# Altium footprint library pcb2D3D库101.PcbLib: 411 footprints (part 4 of 26)
Each footprint in its own frame and in the unit in brackets; x right, y up, seen from the top. Pads: shape width x height; smd on the part's side, far side on the other; paste and mask are expansions set on the pad; w line width, h text height; cw(c..) or ccw(c..) is an arc to the next point about the centre after c.
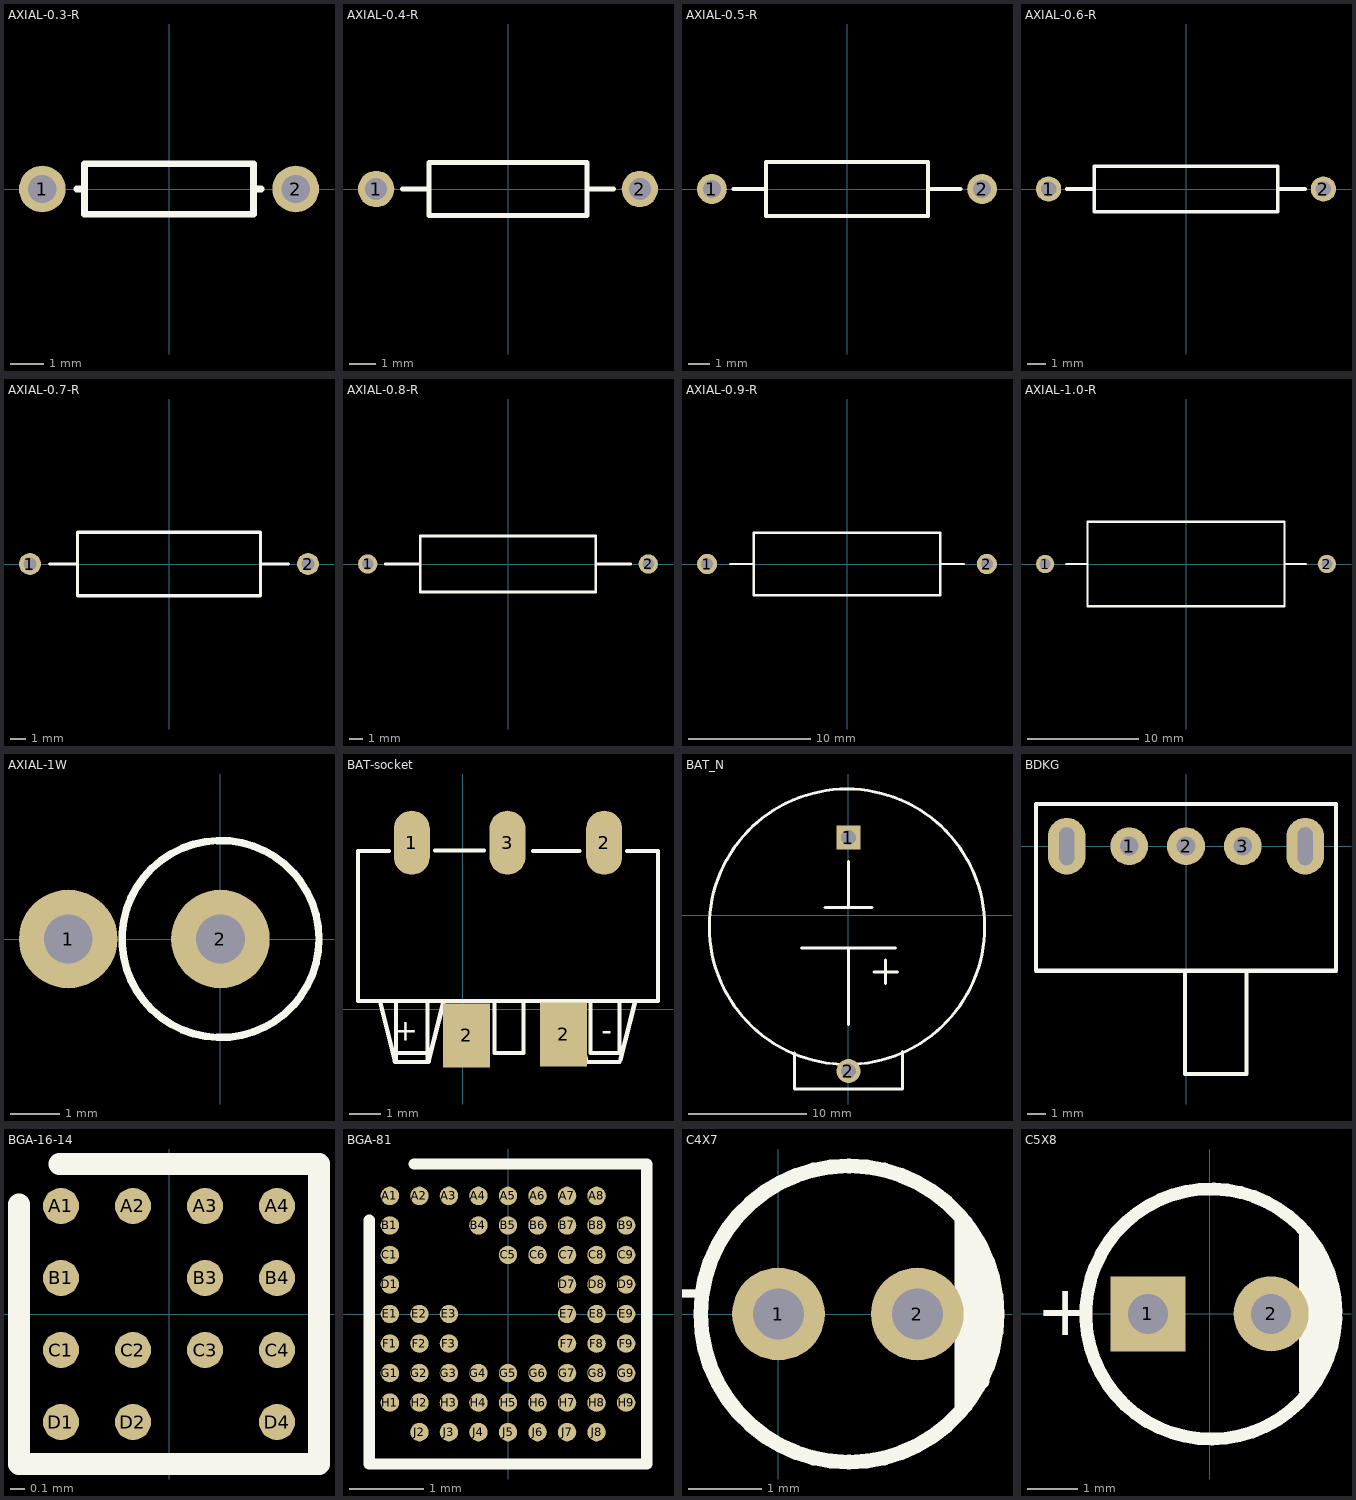
[diagram p3: the footprints below, top view; thin cyan lines are the x and y axes]

## AXIAL-0.3-R [mm] "1/8W"
height 1.524
pads (2):
  round 1.4 hole 0.85: 1(-3.81,0) 2(3.81,0)
TopOverlay:
  lines w0.2: -2.769,0 -2.54,0 ; 2.769,0 2.54,0 ; 2.54,0 2.54,0.762 -2.54,0.762 -2.54,-0.762 2.54,-0.762 2.54,0
3D body "User Library-Resistencia-1.STEP": height 2.36, standoff -1.15, extent -4.064,-0.971 4.064,0.971

## AXIAL-0.4-R [mm] "1/4W/1/2W"
height 2.032
pads (2):
  round 1.4 hole 0.85: 1(-5.08,0) 2(5.08,0)
TopOverlay:
  lines w0.2: -4.064,0 -3.048,0 ; 3.048,0 4.064,0 ; -3.048,-1.016 3.048,-1.016 3.048,1.016 -3.048,1.016 -3.048,-1.016
3D body "AXIAL-0.4-0.25W.STEP": height 3.26, standoff -2, extent -5.38,-1.26 5.38,1.26

## AXIAL-0.5-R [mm] "1/2W/1W"
height 2.54
pads (2):
  round 1.4 hole 0.85: 1(-6.35,0) 2(6.35,0)
TopOverlay:
  lines w0.2: -5.334,0 -3.81,0 ; 3.81,0 5.334,0 ; -3.81,-1.27 3.81,-1.27 3.81,1.27 -3.81,1.27 -3.81,-1.27
3D body "User Library-Resistencia 0_5.STEP": height 3.1, standoff -1.5, extent -6.731,-1.461 6.731,1.397

## AXIAL-0.6-R [mm] "1W"
height 2.54
pads (2):
  round 1.4 hole 0.85: 1(-7.62,0) 2(7.62,0)
TopOverlay:
  lines w0.2: -6.604,0 -5.08,0 ; 5.08,0 6.604,0 ; -5.08,-1.27 5.08,-1.27 5.08,1.27 -5.08,1.27 -5.08,-1.27
3D body "User Library-res_10x15.STEP": height 5.25, standoff -1.5, extent -7.85,-2.25 7.85,2.25

## AXIAL-0.7-R [mm] "Axial Device, Thru-Hole; 2 Leads; 0.7 in Pin Spacing"
height 4.064
pads (2):
  round 1.4 hole 0.85: 1(-8.89,0) 2(8.89,0)
TopOverlay:
  lines w0.2: -7.62,0 -5.842,0 ; 5.842,0 7.62,0 ; -5.842,-2.032 5.842,-2.032 5.842,2.032 -5.842,2.032 -5.842,-2.032
3D body "SW3dPS-1.2w wid-1.STEP": height 5.1, standoff -2.9, extent -9.29,-2.413 9.29,2.587

## AXIAL-0.8-R [mm] "2W"
height 4.064
pads (2):
  round 1.4 hole 0.85: 1(-10.16,0) 2(10.16,0)
TopOverlay:
  lines w0.2: -8.89,0 -6.35,0 ; 6.35,0 8.89,0 ; -6.35,-2.032 6.35,-2.032 6.35,2.032 -6.35,2.032 -6.35,-2.032
3D body "SW3DPS-AXIAL0_8-DEFAULT.STEP": height 4.72, standoff -2.54, extent -10.414,-2.159 10.16,2.195

## AXIAL-0.9-R [mm] "Axial Device, Thru-Hole; 2 Leads; 0.9 in Pin Spacing"
height 5.08
pads (2):
  round 1.65 hole 1: 1(-11.43,0) 2(11.43,0)
TopOverlay:
  lines w0.2: -9.525,0 -7.62,0 ; 7.62,0 9.525,0 ; -7.62,-2.54 -7.62,2.54 7.62,2.54 7.62,-2.54 -7.62,-2.54
3D body "SW3DPS-AXIAL0_9-DEFAULT.STEP": height 5.62, standoff -2.79, extent -11.557,-2.608 11.557,2.794

## AXIAL-1.0-R [mm] "3W"
height 7.62
pads (2):
  round 1.65 hole 1: 1(-12.7,0) 2(12.7,0)
TopOverlay:
  lines w0.2: -10.795,0 -8.89,0 ; 8.89,0 10.795,0 ; -8.89,-3.81 -8.89,3.81 8.89,3.81 8.89,-3.81 -8.89,-3.81
3D body "SW3DPS-AXIAL1_0-DEFAULT.STEP": height 7.73, standoff -2.54, extent -13.005,-3.912 12.649,3.93

## AXIAL-1W [mil]
pads (2):
  round 79 hole 39: 1(-122.05,0) 2(0,0)
TopOverlay:
  circle w6: c0,0 r79
3D body "1W Carbon Film Resistor.STEP": height 572.61, standoff -75.5, extent -137.24,-83.36 83.23,82

## BAT-socket [mm]
pads (5):
  oval 1.143x2.032 smd: 1(-1.62,5.283) 2(4.49,5.283) 3(1.42,5.283)
  rect 1.5x2.032 smd: 2(0.12,-0.83) 2(3.2,-0.8)
TopOverlay:
  drawing of 432 lines, arcs and shapes, not listed
  text "-" at 4.75,-1.01 h0.7
  text "+" at -1.41,-1.01 h0.7
3D body "BAT-SOCKET.STEP": height 6.9, standoff 0.15, extent -3.302,-2.072 6.198,5.73

## BAT_N [mil] "CR2032电池座（未加焊）"
pads (2):
  rect 80x80 hole 50: 1(0.21,260.42)
  round 80 hole 50: 2(0.21,-519.58)
TopOverlay:
  circle w10: c-4.79,-37.58 r460
  lines w10: -179.79,-459.58 -179.79,-579.58 180.21,-579.58 180.21,-453.58 ; -156.79,-108.58 157.21,-108.58 ; -77.79,27.34 78.21,27.34 ; 0.21,-364.58 0.21,-108.58 ; 0.21,28.73 0.21,180.42 ; 85.43,-188.34 164.43,-188.34 ; 124.43,-227.34 124.43,-148.34
3D body "bat_n.stp": height 301.57, standoff -181.11, extent -435.69,-565.55 435.69,385.94

## BDKG [mm]
pads (5):
  round 2 hole 1: 1(-3,0) 2(0,0) 3(3,0)
  oval 2x3 hole 0.8 slot 2 at 90 deg: ""(-6.3,0) ""(6.3,0)
TopOverlay:
  lines w0.203: -0.051,-6.579 -0.051,-12.04 3.2,-12.04 3.2,-6.579
  lines w0.22: -7.925,-6.579 7.925,-6.579 7.925,2.235 -7.925,2.235 -7.925,-6.579
3D body "bodongkuaiguan.STEP": height 6.25, standoff -2.85, extent -6.489,-12.266 6.511,0.634

## BGA-16-14 [mm]
height 0.65
pads (14):
  round 0.25 smd: A1(-0.75,0.75) A2(-0.25,0.75) A3(0.25,0.75) A4(0.75,0.75) B1(-0.75,0.25) B3(0.25,0.25) B4(0.75,0.25) C1(-0.75,-0.25) C2(-0.25,-0.25) C3(0.25,-0.25) C4(0.75,-0.25) D1(-0.75,-0.75) D2(-0.25,-0.75) D4(0.75,-0.75)
TopOverlay:
  lines w0.152: -1.041,0.762 -1.041,-1.041 1.041,-1.041 1.041,1.041 -0.762,1.041
3D body "BGA-16-14.STEP": height 0.65, standoff 0, extent -0.98,-0.98 0.98,0.98

## BGA-81 [mm]
height 0.55
pads (62):
  round 0.25 smd: A1(-1.6,1.6) A2(-1.2,1.6) A3(-0.8,1.6) A4(-0.4,1.6) A5(0,1.6) A6(0.4,1.6) A7(0.8,1.6) A8(1.2,1.6) B1(-1.6,1.2) B4(-0.4,1.2) B5(0,1.2) B6(0.4,1.2) B7(0.8,1.2) B8(1.2,1.2) B9(1.6,1.2) C1(-1.6,0.8) C5(0,0.8) C6(0.4,0.8) C7(0.8,0.8) C8(1.2,0.8) C9(1.6,0.8) D1(-1.6,0.4) D7(0.8,0.4) D8(1.2,0.4) D9(1.6,0.4) E1(-1.6,0) E2(-1.2,0) E3(-0.8,0) E7(0.8,0) E8(1.2,0) E9(1.6,0) F1(-1.6,-0.4) F2(-1.2,-0.4) F3(-0.8,-0.4) F7(0.8,-0.4) F8(1.2,-0.4) F9(1.6,-0.4) G1(-1.6,-0.8) G2(-1.2,-0.8) G3(-0.8,-0.8) G4(-0.4,-0.8) G5(0,-0.8) G6(0.4,-0.8) G7(0.8,-0.8) G8(1.2,-0.8) G9(1.6,-0.8) H1(-1.6,-1.2) H2(-1.2,-1.2) H3(-0.8,-1.2) H4(-0.4,-1.2) H5(0,-1.2) H6(0.4,-1.2) H7(0.8,-1.2) H8(1.2,-1.2) H9(1.6,-1.2) J2(-1.2,-1.6) J3(-0.8,-1.6) J4(-0.4,-1.6) J5(0,-1.6) J6(0.4,-1.6) J7(0.8,-1.6) J8(1.2,-1.6)
TopOverlay:
  lines w0.152: -1.88,1.27 -1.88,-2.032 1.88,-2.032 1.88,2.032 -1.27,2.032
3D body "BGA-81.STEP": height 0.55, standoff 0, extent -1.775,-1.935 1.775,1.945

## C4X7 [mm]
pads (2):
  round 1.27 hole 0.7: 1(0,0) 2(1.905,0)
TopOverlay:
  circle w0.203: c0.965,0 r2.032
  lines w0.254: 2.54,-1.245 2.54,1.245 ; 2.769,-0.914 2.769,0.864
  text "+" at -1.118,-0.305 h1.02
3D body "Cap 4x7.STEP": height 7.01, standoff -16.99, extent -1.028,-1.981 2.972,2.019

## C5X8 [mm] "RB.1/.2"
pads (2):
  rect 1.5x1.5 hole 0.8: 1(-1.231,0)
  round 1.5 hole 0.8: 2(1.231,0)
TopOverlay:
  lines w0.254: 2.526,-0.076 cw(c0.028,-0.004) 2.527,0.037
  lines w0.3: 1.942,-1.524 1.942,1.549
  lines w0.5: 2.196,-0.94 2.196,0.94
  text "+" at -3.468,-0.432 h1.02
3D body "C5x8.STEP": height 8.13, standoff -2.37, extent -2.499,-2.503 2.501,2.489